# Altium schematic symbol library jlcpcb_2025_04_resistors_extended_2512.schlib: 2667 symbols (part 8 of 14) (continued)
## HPCR2512F0000K9
designator R?  Resistance: 0Ω  (hidden comment: *)
Resistor, 0Ω, ±1%, 2W, 200V, ±100ppm/℃, -55℃~+125℃, SMD 2512; Manufacturer: Uniroyal; Manufacturer Part Number: HPCR2512F0000K9; Supplier 1: LCSC; Supplier Part Number 1: C365489; JLCPCB Part Number: C365489; Power Rating: 2W; Category: Resistors; Package Size: 2512; JLCPCB Basic Part: Yes; Tolerance: ±1%; Voltage Rating: 200V; Temperature Coefficient: ±100ppm/℃; Temperature Rating: -55℃~+125℃; ComponentLink1Description: Datasheet; ComponentLink1URL: https://wmsc.lcsc.com/wmsc/upload/file/pdf/v2/lcsc/2304140030_RESI-HPCR2512F0000K9_C365489.pdf; ComponentLink2Description: JLCPCB Part URL; ComponentLink2URL: https://jlcpcb.com/partdetail/C365489
pins: 1, 2
1 alternate drawing of the same symbol

## HPCR2512F12R0K9
designator R?  Resistance: 12Ω  (hidden comment: *)
Resistor, 12Ω, ±1%, 2W, 200V, ±100ppm/℃, -55℃~+125℃, SMD 2512; Manufacturer: Uniroyal; Manufacturer Part Number: HPCR2512F12R0K9; Supplier 1: LCSC; Supplier Part Number 1: C365371; JLCPCB Part Number: C365371; Power Rating: 2W; Category: Resistors; Package Size: 2512; JLCPCB Basic Part: Yes; Tolerance: ±1%; Voltage Rating: 200V; Temperature Coefficient: ±100ppm/℃; Temperature Rating: -55℃~+125℃; ComponentLink1Description: Datasheet; ComponentLink1URL: https://wmsc.lcsc.com/wmsc/upload/file/pdf/v2/lcsc/2304140030_RESI-HPCR2512F12R0K9_C365371.pdf; ComponentLink2Description: JLCPCB Part URL; ComponentLink2URL: https://jlcpcb.com/partdetail/C365371
pins: 1, 2
1 alternate drawing of the same symbol

## HR2512F1M00E04Z
designator R?  Resistance: 1MΩ  (hidden comment: *)
Resistor, 1MΩ, ±1%, 1W, 800V, -55℃~+155℃, SMD 2512; Manufacturer: Uniroyal; Manufacturer Part Number: HR2512F1M00E04Z; Supplier 1: LCSC; Supplier Part Number 1: C175531; JLCPCB Part Number: C175531; Power Rating: 1W; Category: Resistors; Package Size: 2512; JLCPCB Basic Part: Yes; Tolerance: ±1%; Voltage Rating: 800V; Temperature Rating: -55℃~+155℃; ComponentLink1Description: Datasheet; ComponentLink1URL: https://wmsc.lcsc.com/wmsc/upload/file/pdf/v2/lcsc/2304140030_Ever-Ohms-Tech-HR2512F1M00E04Z_C175531.pdf; ComponentLink2Description: JLCPCB Part URL; ComponentLink2URL: https://jlcpcb.com/partdetail/C175531
pins: 1, 2
1 alternate drawing of the same symbol

## HR2512F47R0E04Z
designator R?  Resistance: 47Ω  (hidden comment: *)
Resistor, 47Ω, ±1%, 1W, 800V, -55℃~+155℃, SMD 2512; Manufacturer: Uniroyal; Manufacturer Part Number: HR2512F47R0E04Z; Supplier 1: LCSC; Supplier Part Number 1: C175524; JLCPCB Part Number: C175524; Power Rating: 1W; Category: Resistors; Package Size: 2512; JLCPCB Basic Part: Yes; Tolerance: ±1%; Voltage Rating: 800V; Temperature Rating: -55℃~+155℃; ComponentLink1Description: Datasheet; ComponentLink1URL: https://wmsc.lcsc.com/wmsc/upload/file/pdf/v2/lcsc/2304140030_Ever-Ohms-Tech-HR2512F47R0E04Z_C175524.pdf; ComponentLink2Description: JLCPCB Part URL; ComponentLink2URL: https://jlcpcb.com/partdetail/C175524
pins: 1, 2
1 alternate drawing of the same symbol

## HR2512F220KE04Z
designator R?  Resistance: 220kΩ  (hidden comment: *)
Resistor, 220kΩ, ±1%, 1W, 800V, -55℃~+155℃, SMD 2512; Manufacturer: Uniroyal; Manufacturer Part Number: HR2512F220KE04Z; Supplier 1: LCSC; Supplier Part Number 1: C175527; JLCPCB Part Number: C175527; Power Rating: 1W; Category: Resistors; Package Size: 2512; JLCPCB Basic Part: Yes; Tolerance: ±1%; Voltage Rating: 800V; Temperature Rating: -55℃~+155℃; ComponentLink1Description: Datasheet; ComponentLink1URL: https://wmsc.lcsc.com/wmsc/upload/file/pdf/v2/lcsc/2304140030_Ever-Ohms-Tech-HR2512F220KE04Z_C175527.pdf; ComponentLink2Description: JLCPCB Part URL; ComponentLink2URL: https://jlcpcb.com/partdetail/C175527
pins: 1, 2
1 alternate drawing of the same symbol

## HR2512F240KE04Z
designator R?  Resistance: 240kΩ  (hidden comment: *)
Resistor, 240kΩ, ±1%, 1W, 800V, -55℃~+155℃, SMD 2512; Manufacturer: Uniroyal; Manufacturer Part Number: HR2512F240KE04Z; Supplier 1: LCSC; Supplier Part Number 1: C175528; JLCPCB Part Number: C175528; Power Rating: 1W; Category: Resistors; Package Size: 2512; JLCPCB Basic Part: Yes; Tolerance: ±1%; Voltage Rating: 800V; Temperature Rating: -55℃~+155℃; ComponentLink1Description: Datasheet; ComponentLink1URL: https://wmsc.lcsc.com/wmsc/upload/file/pdf/v2/lcsc/2304140030_Ever-Ohms-Tech-HR2512F240KE04Z_C175528.pdf; ComponentLink2Description: JLCPCB Part URL; ComponentLink2URL: https://jlcpcb.com/partdetail/C175528
pins: 1, 2
1 alternate drawing of the same symbol

## HR2512F560KE04Z
designator R?  Resistance: 560kΩ  (hidden comment: *)
Resistor, 560kΩ, ±1%, 1W, 800V, -55℃~+155℃, SMD 2512; Manufacturer: Uniroyal; Manufacturer Part Number: HR2512F560KE04Z; Supplier 1: LCSC; Supplier Part Number 1: C175529; JLCPCB Part Number: C175529; Power Rating: 1W; Category: Resistors; Package Size: 2512; JLCPCB Basic Part: Yes; Tolerance: ±1%; Voltage Rating: 800V; Temperature Rating: -55℃~+155℃; ComponentLink1Description: Datasheet; ComponentLink1URL: https://wmsc.lcsc.com/wmsc/upload/file/pdf/v2/lcsc/2304140030_Ever-Ohms-Tech-HR2512F560KE04Z_C175529.pdf; ComponentLink2Description: JLCPCB Part URL; ComponentLink2URL: https://jlcpcb.com/partdetail/C175529
pins: 1, 2
1 alternate drawing of the same symbol

## HR2512J62KE04
designator R?  Resistance: 62kΩ  (hidden comment: *)
Resistor, 62kΩ, ±5%, 1W, 800V, -55℃~+155℃, SMD 2512; Manufacturer: Uniroyal; Manufacturer Part Number: HR2512J62KE04; Supplier 1: LCSC; Supplier Part Number 1: C175532; JLCPCB Part Number: C175532; Power Rating: 1W; Category: Resistors; Package Size: 2512; JLCPCB Basic Part: Yes; Tolerance: ±5%; Voltage Rating: 800V; Temperature Rating: -55℃~+155℃; ComponentLink1Description: Datasheet; ComponentLink1URL: https://wmsc.lcsc.com/wmsc/upload/file/pdf/v2/lcsc/2304140030_Ever-Ohms-Tech-HR2512J62KE04_C175532.pdf; ComponentLink2Description: JLCPCB Part URL; ComponentLink2URL: https://jlcpcb.com/partdetail/C175532
pins: 1, 2
1 alternate drawing of the same symbol

## LMJ25NF2P0R002
designator R?  Resistance: 2mΩ  (hidden comment: *)
Resistor, 2mΩ, ±1%, 2W, ±50ppm/℃, SMD 2512; Manufacturer: Uniroyal; Manufacturer Part Number: LMJ25NF2P0R002; Supplier 1: LCSC; Supplier Part Number 1: C2838943; JLCPCB Part Number: C2838943; Power Rating: 2W; Category: Resistors; Package Size: 2512; JLCPCB Basic Part: Yes; Tolerance: ±1%; Temperature Coefficient: ±50ppm/℃; ComponentLink1Description: Datasheet; ComponentLink1URL: https://wmsc.lcsc.com/wmsc/upload/file/pdf/v2/lcsc/2203210916_prosemi-LMJ25NF2P0R002_C2838943.pdf; ComponentLink2Description: JLCPCB Part URL; ComponentLink2URL: https://jlcpcb.com/partdetail/C2838943
pins: 1, 2
1 alternate drawing of the same symbol

## LMP25KF2P0R220
designator R?  Resistance: 220mΩ  (hidden comment: *)
Resistor, 220mΩ, ±1%, 2W, ±50ppm/℃, SMD 2512; Manufacturer: Uniroyal; Manufacturer Part Number: LMP25KF2P0R220; Supplier 1: LCSC; Supplier Part Number 1: C2937397; JLCPCB Part Number: C2937397; Power Rating: 2W; Category: Resistors; Package Size: 2512; JLCPCB Basic Part: Yes; Tolerance: ±1%; Temperature Coefficient: ±50ppm/℃; ComponentLink1Description: Datasheet; ComponentLink1URL: https://wmsc.lcsc.com/wmsc/upload/file/pdf/v2/lcsc/2201131730_prosemi-LMP25KF2P0R220_C2937397.pdf; ComponentLink2Description: JLCPCB Part URL; ComponentLink2URL: https://jlcpcb.com/partdetail/C2937397
pins: 1, 2
1 alternate drawing of the same symbol

## LMP25KF2P0R500
designator R?  Resistance: 500mΩ  (hidden comment: *)
Resistor, 500mΩ, ±1%, 2W, ±50ppm/℃, SMD 2512; Manufacturer: Uniroyal; Manufacturer Part Number: LMP25KF2P0R500; Supplier 1: LCSC; Supplier Part Number 1: C2937398; JLCPCB Part Number: C2937398; Power Rating: 2W; Category: Resistors; Package Size: 2512; JLCPCB Basic Part: Yes; Tolerance: ±1%; Temperature Coefficient: ±50ppm/℃; ComponentLink1Description: Datasheet; ComponentLink1URL: https://wmsc.lcsc.com/wmsc/upload/file/pdf/v2/lcsc/2201131730_prosemi-LMP25KF2P0R500_C2937398.pdf; ComponentLink2Description: JLCPCB Part URL; ComponentLink2URL: https://jlcpcb.com/partdetail/C2937398
pins: 1, 2
1 alternate drawing of the same symbol

## LMP25MF2P0R003S
designator R?  Resistance: 3mΩ  (hidden comment: *)
Resistor, 3mΩ, ±1%, 2W, ±50ppm/℃, -55℃~+170℃, SMD 2512; Manufacturer: Uniroyal; Manufacturer Part Number: LMP25MF2P0R003S; Supplier 1: LCSC; Supplier Part Number 1: C2937400; JLCPCB Part Number: C2937400; Power Rating: 2W; Category: Resistors; Package Size: 2512; JLCPCB Basic Part: Yes; Tolerance: ±1%; Temperature Coefficient: ±50ppm/℃; Temperature Rating: -55℃~+170℃; ComponentLink1Description: Datasheet; ComponentLink1URL: https://wmsc.lcsc.com/wmsc/upload/file/pdf/v2/lcsc/2201131730_prosemi-LMP25MF2P0R003S_C2937400.pdf; ComponentLink2Description: JLCPCB Part URL; ComponentLink2URL: https://jlcpcb.com/partdetail/C2937400
pins: 1, 2
1 alternate drawing of the same symbol

## LMP25MF2P0R004S
designator R?  Resistance: 4mΩ  (hidden comment: *)
Resistor, 4mΩ, ±1%, 2W, ±50ppm/℃, SMD 2512; Manufacturer: Uniroyal; Manufacturer Part Number: LMP25MF2P0R004S; Supplier 1: LCSC; Supplier Part Number 1: C2937401; JLCPCB Part Number: C2937401; Power Rating: 2W; Category: Resistors; Package Size: 2512; JLCPCB Basic Part: Yes; Tolerance: ±1%; Temperature Coefficient: ±50ppm/℃; ComponentLink1Description: Datasheet; ComponentLink1URL: https://wmsc.lcsc.com/wmsc/upload/file/pdf/v2/lcsc/2201131730_prosemi-LMP25MF2P0R004S_C2937401.pdf; ComponentLink2Description: JLCPCB Part URL; ComponentLink2URL: https://jlcpcb.com/partdetail/C2937401
pins: 1, 2
1 alternate drawing of the same symbol

## LMP25MF2P0R005
designator R?  Resistance: 5mΩ  (hidden comment: *)
Resistor, 5mΩ, ±1%, 2W, ±50ppm/℃, SMD 2512; Manufacturer: Uniroyal; Manufacturer Part Number: LMP25MF2P0R005; Supplier 1: LCSC; Supplier Part Number 1: C2937402; JLCPCB Part Number: C2937402; Power Rating: 2W; Category: Resistors; Package Size: 2512; JLCPCB Basic Part: Yes; Tolerance: ±1%; Temperature Coefficient: ±50ppm/℃; ComponentLink1Description: Datasheet; ComponentLink1URL: https://wmsc.lcsc.com/wmsc/upload/file/pdf/v2/lcsc/2201131730_prosemi-LMP25MF2P0R005_C2937402.pdf; ComponentLink2Description: JLCPCB Part URL; ComponentLink2URL: https://jlcpcb.com/partdetail/C2937402
pins: 1, 2
1 alternate drawing of the same symbol

## LMP25MF2P0R010
designator R?  Resistance: 10mΩ  (hidden comment: *)
Resistor, 10mΩ, ±1%, 2W, ±50ppm/℃, SMD 2512; Manufacturer: Uniroyal; Manufacturer Part Number: LMP25MF2P0R010; Supplier 1: LCSC; Supplier Part Number 1: C2937403; JLCPCB Part Number: C2937403; Power Rating: 2W; Category: Resistors; Package Size: 2512; JLCPCB Basic Part: Yes; Tolerance: ±1%; Temperature Coefficient: ±50ppm/℃; ComponentLink1Description: Datasheet; ComponentLink1URL: https://wmsc.lcsc.com/wmsc/upload/file/pdf/v2/lcsc/2201131730_prosemi-LMP25MF2P0R010_C2937403.pdf; ComponentLink2Description: JLCPCB Part URL; ComponentLink2URL: https://jlcpcb.com/partdetail/C2937403
pins: 1, 2
1 alternate drawing of the same symbol

## LMP25MF3P0R001S
designator R?  Resistance: 1mΩ  (hidden comment: *)
Resistor, 1mΩ, ±1%, 3W, ±50ppm/℃, -55℃~+170℃, SMD 2512; Manufacturer: Uniroyal; Manufacturer Part Number: LMP25MF3P0R001S; Supplier 1: LCSC; Supplier Part Number 1: C2937404; JLCPCB Part Number: C2937404; Power Rating: 3W; Category: Resistors; Package Size: 2512; JLCPCB Basic Part: Yes; Tolerance: ±1%; Temperature Coefficient: ±50ppm/℃; Temperature Rating: -55℃~+170℃; ComponentLink1Description: Datasheet; ComponentLink1URL: https://wmsc.lcsc.com/wmsc/upload/file/pdf/v2/lcsc/2201131730_prosemi-LMP25MF3P0R001S_C2937404.pdf; ComponentLink2Description: JLCPCB Part URL; ComponentLink2URL: https://jlcpcb.com/partdetail/C2937404
pins: 1, 2
1 alternate drawing of the same symbol

## LMP25MF3P0R003S
designator R?  Resistance: 3mΩ  (hidden comment: *)
Resistor, 3mΩ, ±1%, 3W, ±50ppm/℃, SMD 2512; Manufacturer: Uniroyal; Manufacturer Part Number: LMP25MF3P0R003S; Supplier 1: LCSC; Supplier Part Number 1: C2937405; JLCPCB Part Number: C2937405; Power Rating: 3W; Category: Resistors; Package Size: 2512; JLCPCB Basic Part: Yes; Tolerance: ±1%; Temperature Coefficient: ±50ppm/℃; ComponentLink1Description: Datasheet; ComponentLink1URL: https://wmsc.lcsc.com/wmsc/upload/file/pdf/v2/lcsc/2201131730_prosemi-LMP25MF3P0R003S_C2937405.pdf; ComponentLink2Description: JLCPCB Part URL; ComponentLink2URL: https://jlcpcb.com/partdetail/C2937405
pins: 1, 2
1 alternate drawing of the same symbol

## LMP25NF2P0R012
designator R?  Resistance: 12mΩ  (hidden comment: *)
Resistor, 12mΩ, ±1%, 2W, ±50ppm/℃, SMD 2512; Manufacturer: Uniroyal; Manufacturer Part Number: LMP25NF2P0R012; Supplier 1: LCSC; Supplier Part Number 1: C2937408; JLCPCB Part Number: C2937408; Power Rating: 2W; Category: Resistors; Package Size: 2512; JLCPCB Basic Part: Yes; Tolerance: ±1%; Temperature Coefficient: ±50ppm/℃; ComponentLink1Description: Datasheet; ComponentLink1URL: https://wmsc.lcsc.com/wmsc/upload/file/pdf/v2/lcsc/2201131730_prosemi-LMP25NF2P0R012_C2937408.pdf; ComponentLink2Description: JLCPCB Part URL; ComponentLink2URL: https://jlcpcb.com/partdetail/C2937408
pins: 1, 2
1 alternate drawing of the same symbol

## LMP25NF2P0R075
designator R?  Resistance: 75mΩ  (hidden comment: *)
Resistor, 75mΩ, ±1%, 2W, ±50ppm/℃, SMD 2512; Manufacturer: Uniroyal; Manufacturer Part Number: LMP25NF2P0R075; Supplier 1: LCSC; Supplier Part Number 1: C2937410; JLCPCB Part Number: C2937410; Power Rating: 2W; Category: Resistors; Package Size: 2512; JLCPCB Basic Part: Yes; Tolerance: ±1%; Temperature Coefficient: ±50ppm/℃; ComponentLink1Description: Datasheet; ComponentLink1URL: https://wmsc.lcsc.com/wmsc/upload/file/pdf/v2/lcsc/2201131730_prosemi-LMP25NF2P0R075_C2937410.pdf; ComponentLink2Description: JLCPCB Part URL; ComponentLink2URL: https://jlcpcb.com/partdetail/C2937410
pins: 1, 2
1 alternate drawing of the same symbol

## LMP25NF3P0R035
designator R?  Resistance: 35mΩ  (hidden comment: *)
Resistor, 35mΩ, ±1%, 3W, ±50ppm/℃, SMD 2512; Manufacturer: Uniroyal; Manufacturer Part Number: LMP25NF3P0R035; Supplier 1: LCSC; Supplier Part Number 1: C2937411; JLCPCB Part Number: C2937411; Power Rating: 3W; Category: Resistors; Package Size: 2512; JLCPCB Basic Part: Yes; Tolerance: ±1%; Temperature Coefficient: ±50ppm/℃; ComponentLink1Description: Datasheet; ComponentLink1URL: https://wmsc.lcsc.com/wmsc/upload/file/pdf/v2/lcsc/2203221230_prosemi-LMP25NF3P0R035_C2937411.pdf; ComponentLink2Description: JLCPCB Part URL; ComponentLink2URL: https://jlcpcb.com/partdetail/C2937411
pins: 1, 2
1 alternate drawing of the same symbol

## LMP25NF3P0R060
designator R?  Resistance: 60mΩ  (hidden comment: *)
Resistor, 60mΩ, ±1%, 3W, ±50ppm/℃, SMD 2512; Manufacturer: Uniroyal; Manufacturer Part Number: LMP25NF3P0R060; Supplier 1: LCSC; Supplier Part Number 1: C2937412; JLCPCB Part Number: C2937412; Power Rating: 3W; Category: Resistors; Package Size: 2512; JLCPCB Basic Part: Yes; Tolerance: ±1%; Temperature Coefficient: ±50ppm/℃; ComponentLink1Description: Datasheet; ComponentLink1URL: https://wmsc.lcsc.com/wmsc/upload/file/pdf/v2/lcsc/2203221230_prosemi-LMP25NF3P0R060_C2937412.pdf; ComponentLink2Description: JLCPCB Part URL; ComponentLink2URL: https://jlcpcb.com/partdetail/C2937412
pins: 1, 2
1 alternate drawing of the same symbol

## LR12FTDSR001
designator R?  Resistance: 1mΩ  (hidden comment: *)
Resistor, 1mΩ, ±1%, 2W, ±50ppm/℃, -55℃~+170℃, SMD 2512; Manufacturer: Uniroyal; Manufacturer Part Number: LR12FTDSR001; Supplier 1: LCSC; Supplier Part Number 1: C2913006; JLCPCB Part Number: C2913006; Power Rating: 2W; Category: Resistors; Package Size: 2512; JLCPCB Basic Part: Yes; Tolerance: ±1%; Temperature Coefficient: ±50ppm/℃; Temperature Rating: -55℃~+170℃; ComponentLink1Description: Datasheet; ComponentLink1URL: https://wmsc.lcsc.com/wmsc/upload/file/pdf/v2/lcsc/2110281830_Viking-Tech-LR12FTDSR001_C2913006.pdf; ComponentLink2Description: JLCPCB Part URL; ComponentLink2URL: https://jlcpcb.com/partdetail/C2913006
pins: 1, 2
1 alternate drawing of the same symbol

## LR122WF220LT4E
designator R?  Resistance: 220mΩ  (hidden comment: *)
Resistor, 220mΩ, ±1%, 2W, SMD 2512; Manufacturer: Uniroyal; Manufacturer Part Number: LR122WF220LT4E; Supplier 1: LCSC; Supplier Part Number 1: C2941078; JLCPCB Part Number: C2941078; Power Rating: 2W; Category: Resistors; Package Size: 2512; JLCPCB Basic Part: Yes; Tolerance: ±1%; ComponentLink1Description: Datasheet; ComponentLink1URL: https://wmsc.lcsc.com/wmsc/upload/file/pdf/v2/lcsc/2308091127_UNI-ROYAL-Uniroyal-Elec-LR122WF220LT4E_C2941078.pdf; ComponentLink2Description: JLCPCB Part URL; ComponentLink2URL: https://jlcpcb.com/partdetail/C2941078
pins: 1, 2
1 alternate drawing of the same symbol

## LR122WF500MT4E
designator R?  Resistance: 50mΩ  (hidden comment: *)
Resistor, 50mΩ, ±1%, 2W, ±50ppm/℃, SMD 2512; Manufacturer: Uniroyal; Manufacturer Part Number: LR122WF500MT4E; Supplier 1: LCSC; Supplier Part Number 1: C2941069; JLCPCB Part Number: C2941069; Power Rating: 2W; Category: Resistors; Package Size: 2512; JLCPCB Basic Part: Yes; Tolerance: ±1%; Temperature Coefficient: ±50ppm/℃; ComponentLink1Description: Datasheet; ComponentLink1URL: https://wmsc.lcsc.com/wmsc/upload/file/pdf/v2/lcsc/2207141800_UNI-ROYAL-Uniroyal-Elec-LR122WF500MT4E_C2941069.pdf; ComponentLink2Description: JLCPCB Part URL; ComponentLink2URL: https://jlcpcb.com/partdetail/C2941069
pins: 1, 2
1 alternate drawing of the same symbol

## LR123WF100NT4E
designator R?  Resistance: 1mΩ  (hidden comment: *)
Resistor, 1mΩ, ±1%, 3W, ±50ppm/℃, SMD 2512; Manufacturer: Uniroyal; Manufacturer Part Number: LR123WF100NT4E; Supplier 1: LCSC; Supplier Part Number 1: C2941088; JLCPCB Part Number: C2941088; Power Rating: 3W; Category: Resistors; Package Size: 2512; JLCPCB Basic Part: Yes; Tolerance: ±1%; Temperature Coefficient: ±50ppm/℃; ComponentLink1Description: Datasheet; ComponentLink1URL: https://wmsc.lcsc.com/wmsc/upload/file/pdf/v2/lcsc/2204181745_UNI-ROYAL-Uniroyal-Elec-LR123WF100NT4E_C2941088.pdf; ComponentLink2Description: JLCPCB Part URL; ComponentLink2URL: https://jlcpcb.com/partdetail/C2941088
pins: 1, 2
1 alternate drawing of the same symbol

## LR123WF300NT4E
designator R?  Resistance: 3mΩ  (hidden comment: *)
Resistor, 3mΩ, ±1%, 3W, ±50ppm/℃, SMD 2512; Manufacturer: Uniroyal; Manufacturer Part Number: LR123WF300NT4E; Supplier 1: LCSC; Supplier Part Number 1: C2941089; JLCPCB Part Number: C2941089; Power Rating: 3W; Category: Resistors; Package Size: 2512; JLCPCB Basic Part: Yes; Tolerance: ±1%; Temperature Coefficient: ±50ppm/℃; ComponentLink1Description: Datasheet; ComponentLink1URL: https://wmsc.lcsc.com/wmsc/upload/file/pdf/v2/lcsc/2204181745_UNI-ROYAL-Uniroyal-Elec-LR123WF300NT4E_C2941089.pdf; ComponentLink2Description: JLCPCB Part URL; ComponentLink2URL: https://jlcpcb.com/partdetail/C2941089
pins: 1, 2
1 alternate drawing of the same symbol

## MCPWR12FTEA0330
designator R?  Resistance: 33Ω  (hidden comment: *)
Resistor, 33Ω, ±1%, 1.5W, SMD 2512; Manufacturer: Uniroyal; Manufacturer Part Number: MCPWR12FTEA0330; Supplier 1: LCSC; Supplier Part Number 1: C243034; JLCPCB Part Number: C243034; Power Rating: 1.5W; Category: Resistors; Package Size: 2512; JLCPCB Basic Part: Yes; Tolerance: ±1%; ComponentLink1Description: Datasheet; ComponentLink1URL: https://wmsc.lcsc.com/wmsc/upload/file/pdf/v2/lcsc/2304140030_Multicomp-MCPWR12FTEA0330_C243034.pdf; ComponentLink2Description: JLCPCB Part URL; ComponentLink2URL: https://jlcpcb.com/partdetail/C243034
pins: 1, 2
1 alternate drawing of the same symbol

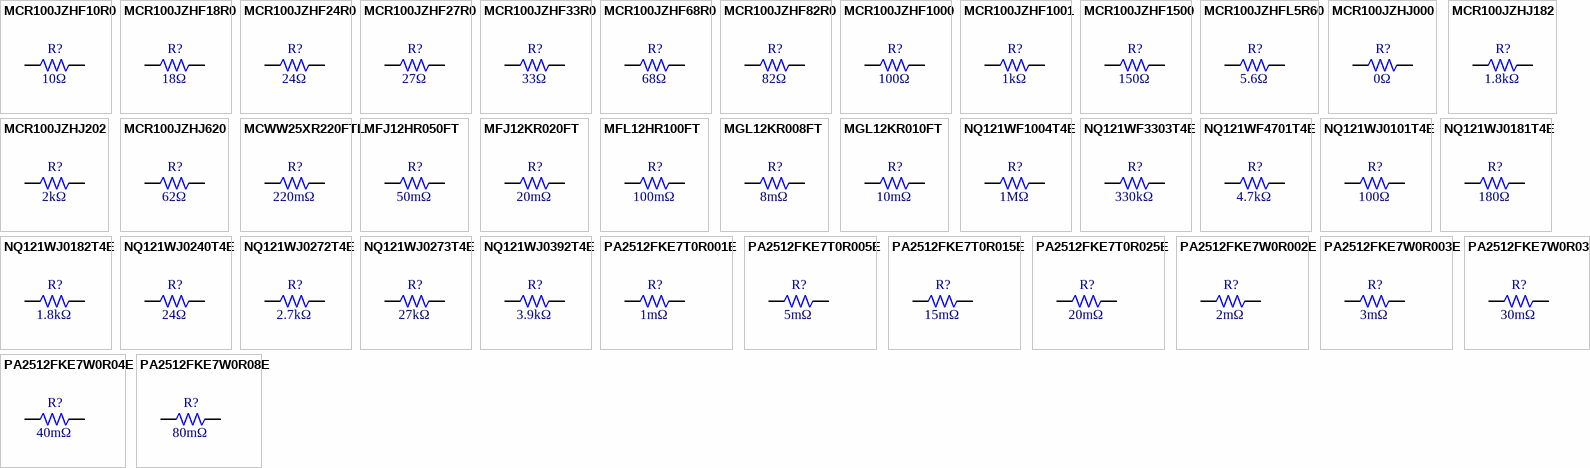
[diagram p39: symbols MCR100JZHF10R0 to PA2512FKE7W0R08E]

## MCR100JZHF10R0
designator R?  Resistance: 10Ω  (hidden comment: *)
Resistor, 10Ω, ±1%, 1W, ±100ppm/℃, SMD 2512; Manufacturer: Uniroyal; Manufacturer Part Number: MCR100JZHF10R0; Supplier 1: LCSC; Supplier Part Number 1: C162016; JLCPCB Part Number: C162016; Power Rating: 1W; Category: Resistors; Package Size: 2512; JLCPCB Basic Part: Yes; Tolerance: ±1%; Temperature Coefficient: ±100ppm/℃; ComponentLink1Description: Datasheet; ComponentLink1URL: https://wmsc.lcsc.com/wmsc/upload/file/pdf/v2/lcsc/2007130932_ROHM-Semicon-MCR100JZHF10R0_C162016.pdf; ComponentLink2Description: JLCPCB Part URL; ComponentLink2URL: https://jlcpcb.com/partdetail/C162016
pins: 1, 2
1 alternate drawing of the same symbol

## MCR100JZHF18R0
designator R?  Resistance: 18Ω  (hidden comment: *)
Resistor, 18Ω, ±1%, 1W, 150V, ±100ppm/℃, -55℃~+155℃, SMD 2512; Manufacturer: Uniroyal; Manufacturer Part Number: MCR100JZHF18R0; Supplier 1: LCSC; Supplier Part Number 1: C308341; JLCPCB Part Number: C308341; Power Rating: 1W; Category: Resistors; Package Size: 2512; JLCPCB Basic Part: Yes; Tolerance: ±1%; Voltage Rating: 150V; Temperature Coefficient: ±100ppm/℃; Temperature Rating: -55℃~+155℃; ComponentLink1Description: Datasheet; ComponentLink1URL: https://wmsc.lcsc.com/wmsc/upload/file/pdf/v2/lcsc/2304140030_ROHM-Semicon-MCR100JZHF18R0_C308341.pdf; ComponentLink2Description: JLCPCB Part URL; ComponentLink2URL: https://jlcpcb.com/partdetail/C308341
pins: 1, 2
1 alternate drawing of the same symbol

## MCR100JZHF24R0
designator R?  Resistance: 24Ω  (hidden comment: *)
Resistor, 24Ω, ±1%, 1W, 150V, ±100ppm/℃, -55℃~+155℃, SMD 2512; Manufacturer: Uniroyal; Manufacturer Part Number: MCR100JZHF24R0; Supplier 1: LCSC; Supplier Part Number 1: C308344; JLCPCB Part Number: C308344; Power Rating: 1W; Category: Resistors; Package Size: 2512; JLCPCB Basic Part: Yes; Tolerance: ±1%; Voltage Rating: 150V; Temperature Coefficient: ±100ppm/℃; Temperature Rating: -55℃~+155℃; ComponentLink1Description: Datasheet; ComponentLink1URL: https://wmsc.lcsc.com/wmsc/upload/file/pdf/v2/lcsc/2304140030_ROHM-Semicon-MCR100JZHF24R0_C308344.pdf; ComponentLink2Description: JLCPCB Part URL; ComponentLink2URL: https://jlcpcb.com/partdetail/C308344
pins: 1, 2
1 alternate drawing of the same symbol

## MCR100JZHF27R0
designator R?  Resistance: 27Ω  (hidden comment: *)
Resistor, 27Ω, ±1%, 1W, 150V, ±100ppm/℃, -55℃~+155℃, SMD 2512; Manufacturer: Uniroyal; Manufacturer Part Number: MCR100JZHF27R0; Supplier 1: LCSC; Supplier Part Number 1: C507439; JLCPCB Part Number: C507439; Power Rating: 1W; Category: Resistors; Package Size: 2512; JLCPCB Basic Part: Yes; Tolerance: ±1%; Voltage Rating: 150V; Temperature Coefficient: ±100ppm/℃; Temperature Rating: -55℃~+155℃; ComponentLink1Description: Datasheet; ComponentLink1URL: https://wmsc.lcsc.com/wmsc/upload/file/pdf/v2/lcsc/2005301907_ROHM-Semicon-MCR100JZHF27R0_C507439.pdf; ComponentLink2Description: JLCPCB Part URL; ComponentLink2URL: https://jlcpcb.com/partdetail/C507439
pins: 1, 2
1 alternate drawing of the same symbol

## MCR100JZHF33R0
designator R?  Resistance: 33Ω  (hidden comment: *)
Resistor, 33Ω, ±1%, 1W, 150V, ±100ppm/℃, -55℃~+155℃, SMD 2512; Manufacturer: Uniroyal; Manufacturer Part Number: MCR100JZHF33R0; Supplier 1: LCSC; Supplier Part Number 1: C308345; JLCPCB Part Number: C308345; Power Rating: 1W; Category: Resistors; Package Size: 2512; JLCPCB Basic Part: Yes; Tolerance: ±1%; Voltage Rating: 150V; Temperature Coefficient: ±100ppm/℃; Temperature Rating: -55℃~+155℃; ComponentLink1Description: Datasheet; ComponentLink1URL: https://wmsc.lcsc.com/wmsc/upload/file/pdf/v2/lcsc/2304140030_ROHM-Semicon-MCR100JZHF33R0_C308345.pdf; ComponentLink2Description: JLCPCB Part URL; ComponentLink2URL: https://jlcpcb.com/partdetail/C308345
pins: 1, 2
1 alternate drawing of the same symbol

## MCR100JZHF68R0
designator R?  Resistance: 68Ω  (hidden comment: *)
Resistor, 68Ω, ±1%, 1W, 150V, ±100ppm/℃, -55℃~+155℃, SMD 2512; Manufacturer: Uniroyal; Manufacturer Part Number: MCR100JZHF68R0; Supplier 1: LCSC; Supplier Part Number 1: C308347; JLCPCB Part Number: C308347; Power Rating: 1W; Category: Resistors; Package Size: 2512; JLCPCB Basic Part: Yes; Tolerance: ±1%; Voltage Rating: 150V; Temperature Coefficient: ±100ppm/℃; Temperature Rating: -55℃~+155℃; ComponentLink1Description: Datasheet; ComponentLink1URL: https://wmsc.lcsc.com/wmsc/upload/file/pdf/v2/lcsc/2304140030_ROHM-Semicon-MCR100JZHF68R0_C308347.pdf; ComponentLink2Description: JLCPCB Part URL; ComponentLink2URL: https://jlcpcb.com/partdetail/C308347
pins: 1, 2
1 alternate drawing of the same symbol

## MCR100JZHF82R0
designator R?  Resistance: 82Ω  (hidden comment: *)
Resistor, 82Ω, ±1%, 1W, 150V, ±100ppm/℃, -55℃~+155℃, SMD 2512; Manufacturer: Uniroyal; Manufacturer Part Number: MCR100JZHF82R0; Supplier 1: LCSC; Supplier Part Number 1: C308349; JLCPCB Part Number: C308349; Power Rating: 1W; Category: Resistors; Package Size: 2512; JLCPCB Basic Part: Yes; Tolerance: ±1%; Voltage Rating: 150V; Temperature Coefficient: ±100ppm/℃; Temperature Rating: -55℃~+155℃; ComponentLink1Description: Datasheet; ComponentLink1URL: https://wmsc.lcsc.com/wmsc/upload/file/pdf/v2/lcsc/2304140030_ROHM-Semicon-MCR100JZHF82R0_C308349.pdf; ComponentLink2Description: JLCPCB Part URL; ComponentLink2URL: https://jlcpcb.com/partdetail/C308349
pins: 1, 2
1 alternate drawing of the same symbol

## MCR100JZHF1000
designator R?  Resistance: 100Ω  (hidden comment: *)
Resistor, 100Ω, ±1%, 1W, 150V, ±100ppm/℃, -55℃~+155℃, SMD 2512; Manufacturer: Uniroyal; Manufacturer Part Number: MCR100JZHF1000; Supplier 1: LCSC; Supplier Part Number 1: C507452; JLCPCB Part Number: C507452; Power Rating: 1W; Category: Resistors; Package Size: 2512; JLCPCB Basic Part: Yes; Tolerance: ±1%; Voltage Rating: 150V; Temperature Coefficient: ±100ppm/℃; Temperature Rating: -55℃~+155℃; ComponentLink1Description: Datasheet; ComponentLink1URL: https://wmsc.lcsc.com/wmsc/upload/file/pdf/v2/lcsc/2005142146_ROHM-Semicon-MCR100JZHF1000_C507452.pdf; ComponentLink2Description: JLCPCB Part URL; ComponentLink2URL: https://jlcpcb.com/partdetail/C507452
pins: 1, 2
1 alternate drawing of the same symbol

## MCR100JZHF1001
designator R?  Resistance: 1kΩ  (hidden comment: *)
Resistor, 1kΩ, ±1%, 1W, 150V, ±100ppm/℃, -55℃~+155℃, SMD 2512; Manufacturer: Uniroyal; Manufacturer Part Number: MCR100JZHF1001; Supplier 1: LCSC; Supplier Part Number 1: C308340; JLCPCB Part Number: C308340; Power Rating: 1W; Category: Resistors; Package Size: 2512; JLCPCB Basic Part: Yes; Tolerance: ±1%; Voltage Rating: 150V; Temperature Coefficient: ±100ppm/℃; Temperature Rating: -55℃~+155℃; ComponentLink1Description: Datasheet; ComponentLink1URL: https://wmsc.lcsc.com/wmsc/upload/file/pdf/v2/lcsc/2304140030_ROHM-Semicon-MCR100JZHF1001_C308340.pdf; ComponentLink2Description: JLCPCB Part URL; ComponentLink2URL: https://jlcpcb.com/partdetail/C308340
pins: 1, 2
1 alternate drawing of the same symbol

## MCR100JZHF1500
designator R?  Resistance: 150Ω  (hidden comment: *)
Resistor, 150Ω, ±1%, 1W, 150V, ±100ppm/℃, -55℃~+155℃, SMD 2512; Manufacturer: Uniroyal; Manufacturer Part Number: MCR100JZHF1500; Supplier 1: LCSC; Supplier Part Number 1: C507441; JLCPCB Part Number: C507441; Power Rating: 1W; Category: Resistors; Package Size: 2512; JLCPCB Basic Part: Yes; Tolerance: ±1%; Voltage Rating: 150V; Temperature Coefficient: ±100ppm/℃; Temperature Rating: -55℃~+155℃; ComponentLink1Description: Datasheet; ComponentLink1URL: https://wmsc.lcsc.com/wmsc/upload/file/pdf/v2/lcsc/2004021108_ROHM-Semicon-MCR100JZHF1500_C507441.pdf; ComponentLink2Description: JLCPCB Part URL; ComponentLink2URL: https://jlcpcb.com/partdetail/C507441
pins: 1, 2
1 alternate drawing of the same symbol

## MCR100JZHFL5R60
designator R?  Resistance: 5.6Ω  (hidden comment: *)
Resistor, 5.6Ω, ±1%, 1W, 150V, ±100ppm/℃, -55℃~+155℃, SMD 2512; Manufacturer: Uniroyal; Manufacturer Part Number: MCR100JZHFL5R60; Supplier 1: LCSC; Supplier Part Number 1: C308350; JLCPCB Part Number: C308350; Power Rating: 1W; Category: Resistors; Package Size: 2512; JLCPCB Basic Part: Yes; Tolerance: ±1%; Voltage Rating: 150V; Temperature Coefficient: ±100ppm/℃; Temperature Rating: -55℃~+155℃; ComponentLink1Description: Datasheet; ComponentLink1URL: https://wmsc.lcsc.com/wmsc/upload/file/pdf/v2/lcsc/2304140030_ROHM-Semicon-MCR100JZHFL5R60_C308350.pdf; ComponentLink2Description: JLCPCB Part URL; ComponentLink2URL: https://jlcpcb.com/partdetail/C308350
pins: 1, 2
1 alternate drawing of the same symbol

## MCR100JZHJ000
designator R?  Resistance: 0Ω  (hidden comment: *)
Resistor, 0Ω, ±5%, 1W, 150V, -55℃~+155℃, SMD 2512; Manufacturer: Uniroyal; Manufacturer Part Number: MCR100JZHJ000; Supplier 1: LCSC; Supplier Part Number 1: C308352; JLCPCB Part Number: C308352; Power Rating: 1W; Category: Resistors; Package Size: 2512; JLCPCB Basic Part: Yes; Tolerance: ±5%; Voltage Rating: 150V; Temperature Rating: -55℃~+155℃; ComponentLink1Description: Datasheet; ComponentLink1URL: https://wmsc.lcsc.com/wmsc/upload/file/pdf/v2/lcsc/2304140030_ROHM-Semicon-MCR100JZHJ000_C308352.pdf; ComponentLink2Description: JLCPCB Part URL; ComponentLink2URL: https://jlcpcb.com/partdetail/C308352
pins: 1, 2
1 alternate drawing of the same symbol

## MCR100JZHJ182
designator R?  Resistance: 1.8kΩ  (hidden comment: *)
Resistor, 1.8kΩ, ±5%, 1W, 150V, ±200ppm/℃, -55℃~+125℃, SMD 2512; Manufacturer: Uniroyal; Manufacturer Part Number: MCR100JZHJ182; Supplier 1: LCSC; Supplier Part Number 1: C308353; JLCPCB Part Number: C308353; Power Rating: 1W; Category: Resistors; Package Size: 2512; JLCPCB Basic Part: Yes; Tolerance: ±5%; Voltage Rating: 150V; Temperature Coefficient: ±200ppm/℃; Temperature Rating: -55℃~+125℃; ComponentLink1Description: Datasheet; ComponentLink1URL: https://wmsc.lcsc.com/wmsc/upload/file/pdf/v2/lcsc/2304140030_ROHM-Semicon-MCR100JZHJ182_C308353.pdf; ComponentLink2Description: JLCPCB Part URL; ComponentLink2URL: https://jlcpcb.com/partdetail/C308353
pins: 1, 2
1 alternate drawing of the same symbol

## MCR100JZHJ202
designator R?  Resistance: 2kΩ  (hidden comment: *)
Resistor, 2kΩ, ±5%, 1W, 150V, ±200ppm/℃, -55℃~+155℃, SMD 2512; Manufacturer: Uniroyal; Manufacturer Part Number: MCR100JZHJ202; Supplier 1: LCSC; Supplier Part Number 1: C308355; JLCPCB Part Number: C308355; Power Rating: 1W; Category: Resistors; Package Size: 2512; JLCPCB Basic Part: Yes; Tolerance: ±5%; Voltage Rating: 150V; Temperature Coefficient: ±200ppm/℃; Temperature Rating: -55℃~+155℃; ComponentLink1Description: Datasheet; ComponentLink1URL: https://wmsc.lcsc.com/wmsc/upload/file/pdf/v2/lcsc/2304140030_ROHM-Semicon-MCR100JZHJ202_C308355.pdf; ComponentLink2Description: JLCPCB Part URL; ComponentLink2URL: https://jlcpcb.com/partdetail/C308355
pins: 1, 2
1 alternate drawing of the same symbol

## MCR100JZHJ620
designator R?  Resistance: 62Ω  (hidden comment: *)
Resistor, 62Ω, ±5%, 1W, 150V, ±200ppm/℃, -55℃~+155℃, SMD 2512; Manufacturer: Uniroyal; Manufacturer Part Number: MCR100JZHJ620; Supplier 1: LCSC; Supplier Part Number 1: C308357; JLCPCB Part Number: C308357; Power Rating: 1W; Category: Resistors; Package Size: 2512; JLCPCB Basic Part: Yes; Tolerance: ±5%; Voltage Rating: 150V; Temperature Coefficient: ±200ppm/℃; Temperature Rating: -55℃~+155℃; ComponentLink1Description: Datasheet; ComponentLink1URL: https://wmsc.lcsc.com/wmsc/upload/file/pdf/v2/lcsc/2304140030_ROHM-Semicon-MCR100JZHJ620_C308357.pdf; ComponentLink2Description: JLCPCB Part URL; ComponentLink2URL: https://jlcpcb.com/partdetail/C308357
pins: 1, 2
1 alternate drawing of the same symbol

## MCWW25XR220FTL
designator R?  Resistance: 220mΩ  (hidden comment: *)
Resistor, 220mΩ, ±1%, 1W, SMD 2512; Manufacturer: Uniroyal; Manufacturer Part Number: MCWW25XR220FTL; Supplier 1: LCSC; Supplier Part Number 1: C243131; JLCPCB Part Number: C243131; Power Rating: 1W; Category: Resistors; Package Size: 2512; JLCPCB Basic Part: Yes; Tolerance: ±1%; ComponentLink1Description: Datasheet; ComponentLink1URL: https://wmsc.lcsc.com/wmsc/upload/file/pdf/v2/lcsc/2304140030_Multicomp-MCWW25XR220FTL_C243131.pdf; ComponentLink2Description: JLCPCB Part URL; ComponentLink2URL: https://jlcpcb.com/partdetail/C243131
pins: 1, 2
1 alternate drawing of the same symbol

## MFJ12HR050FT
designator R?  Resistance: 50mΩ  (hidden comment: *)
Resistor, 50mΩ, ±1%, 1W, ±50ppm/℃, SMD 2512; Manufacturer: Uniroyal; Manufacturer Part Number: MFJ12HR050FT; Supplier 1: LCSC; Supplier Part Number 1: C2936658; JLCPCB Part Number: C2936658; Power Rating: 1W; Category: Resistors; Package Size: 2512; JLCPCB Basic Part: Yes; Tolerance: ±1%; Temperature Coefficient: ±50ppm/℃; ComponentLink1Description: Datasheet; ComponentLink1URL: https://wmsc.lcsc.com/wmsc/upload/file/pdf/v2/lcsc/2201121730_FH--Guangdong-Fenghua-Advanced-Tech-MFJ12HR050FT_C2936658.pdf; ComponentLink2Description: JLCPCB Part URL; ComponentLink2URL: https://jlcpcb.com/partdetail/C2936658
pins: 1, 2
1 alternate drawing of the same symbol

## MFJ12KR020FT
designator R?  Resistance: 20mΩ  (hidden comment: *)
Resistor, 20mΩ, ±1%, 1W, ±100ppm/℃, SMD 2512; Manufacturer: Uniroyal; Manufacturer Part Number: MFJ12KR020FT; Supplier 1: LCSC; Supplier Part Number 1: C2991588; JLCPCB Part Number: C2991588; Power Rating: 1W; Category: Resistors; Package Size: 2512; JLCPCB Basic Part: Yes; Tolerance: ±1%; Temperature Coefficient: ±100ppm/℃; ComponentLink1Description: Datasheet; ComponentLink1URL: https://wmsc.lcsc.com/wmsc/upload/file/pdf/v2/lcsc/2204111630_FH--Guangdong-Fenghua-Advanced-Tech-MFJ12KR020FT_C2991588.pdf; ComponentLink2Description: JLCPCB Part URL; ComponentLink2URL: https://jlcpcb.com/partdetail/C2991588
pins: 1, 2
1 alternate drawing of the same symbol

## MFL12HR100FT
designator R?  Resistance: 100mΩ  (hidden comment: *)
Resistor, 100mΩ, ±1%, 2W, ±50ppm/℃, -55℃~+170℃, SMD 2512; Manufacturer: Uniroyal; Manufacturer Part Number: MFL12HR100FT; Supplier 1: LCSC; Supplier Part Number 1: C2961477; JLCPCB Part Number: C2961477; Power Rating: 2W; Category: Resistors; Package Size: 2512; JLCPCB Basic Part: Yes; Tolerance: ±1%; Temperature Coefficient: ±50ppm/℃; Temperature Rating: -55℃~+170℃; ComponentLink1Description: Datasheet; ComponentLink1URL: https://wmsc.lcsc.com/wmsc/upload/file/pdf/v2/lcsc/2202090930_FH--Guangdong-Fenghua-Advanced-Tech-MFL12HR100FT_C2961477.pdf; ComponentLink2Description: JLCPCB Part URL; ComponentLink2URL: https://jlcpcb.com/partdetail/C2961477
pins: 1, 2
1 alternate drawing of the same symbol

## MGL12KR008FT
designator R?  Resistance: 8mΩ  (hidden comment: *)
Resistor, 8mΩ, ±1%, 2W, ±100ppm/℃, -55℃~+170℃, SMD 2512; Manufacturer: Uniroyal; Manufacturer Part Number: MGL12KR008FT; Supplier 1: LCSC; Supplier Part Number 1: C1322429; JLCPCB Part Number: C1322429; Power Rating: 2W; Category: Resistors; Package Size: 2512; JLCPCB Basic Part: Yes; Tolerance: ±1%; Temperature Coefficient: ±100ppm/℃; Temperature Rating: -55℃~+170℃; ComponentLink1Description: Datasheet; ComponentLink1URL: https://wmsc.lcsc.com/wmsc/upload/file/pdf/v2/lcsc/2202221830_FH--Guangdong-Fenghua-Advanced-Tech-MGL12KR008FT_C1322429.pdf; ComponentLink2Description: JLCPCB Part URL; ComponentLink2URL: https://jlcpcb.com/partdetail/C1322429
pins: 1, 2
1 alternate drawing of the same symbol

## MGL12KR010FT
designator R?  Resistance: 10mΩ  (hidden comment: *)
Resistor, 10mΩ, ±1%, 2W, ±100ppm/℃, -55℃~+170℃, SMD 2512; Manufacturer: Uniroyal; Manufacturer Part Number: MGL12KR010FT; Supplier 1: LCSC; Supplier Part Number 1: C2961479; JLCPCB Part Number: C2961479; Power Rating: 2W; Category: Resistors; Package Size: 2512; JLCPCB Basic Part: Yes; Tolerance: ±1%; Temperature Coefficient: ±100ppm/℃; Temperature Rating: -55℃~+170℃; ComponentLink1Description: Datasheet; ComponentLink1URL: https://wmsc.lcsc.com/wmsc/upload/file/pdf/v2/lcsc/2202090930_FH--Guangdong-Fenghua-Advanced-Tech-MGL12KR010FT_C2961479.pdf; ComponentLink2Description: JLCPCB Part URL; ComponentLink2URL: https://jlcpcb.com/partdetail/C2961479
pins: 1, 2
1 alternate drawing of the same symbol

## NQ121WF1004T4E
designator R?  Resistance: 1MΩ  (hidden comment: *)
Resistor, 1MΩ, ±1%, 1W, ±100ppm/℃, SMD 2512; Manufacturer: Uniroyal; Manufacturer Part Number: NQ121WF1004T4E; Supplier 1: LCSC; Supplier Part Number 1: C964967; JLCPCB Part Number: C964967; Power Rating: 1W; Category: Resistors; Package Size: 2512; JLCPCB Basic Part: Yes; Tolerance: ±1%; Temperature Coefficient: ±100ppm/℃; ComponentLink1Description: Datasheet; ComponentLink1URL: https://wmsc.lcsc.com/wmsc/upload/file/pdf/v2/lcsc/2304140030_UNI-ROYAL-Uniroyal-Elec-NQ121WF1004T4E_C964967.pdf; ComponentLink2Description: JLCPCB Part URL; ComponentLink2URL: https://jlcpcb.com/partdetail/C964967
pins: 1, 2
1 alternate drawing of the same symbol

## NQ121WF3303T4E
designator R?  Resistance: 330kΩ  (hidden comment: *)
Resistor, 330kΩ, ±1%, 1W, ±100ppm/℃, SMD 2512; Manufacturer: Uniroyal; Manufacturer Part Number: NQ121WF3303T4E; Supplier 1: LCSC; Supplier Part Number 1: C964965; JLCPCB Part Number: C964965; Power Rating: 1W; Category: Resistors; Package Size: 2512; JLCPCB Basic Part: Yes; Tolerance: ±1%; Temperature Coefficient: ±100ppm/℃; ComponentLink1Description: Datasheet; ComponentLink1URL: https://wmsc.lcsc.com/wmsc/upload/file/pdf/v2/lcsc/2304140030_UNI-ROYAL-Uniroyal-Elec-NQ121WF3303T4E_C964965.pdf; ComponentLink2Description: JLCPCB Part URL; ComponentLink2URL: https://jlcpcb.com/partdetail/C964965
pins: 1, 2
1 alternate drawing of the same symbol

## NQ121WF4701T4E
designator R?  Resistance: 4.7kΩ  (hidden comment: *)
Resistor, 4.7kΩ, ±1%, 1W, ±100ppm/℃, SMD 2512; Manufacturer: Uniroyal; Manufacturer Part Number: NQ121WF4701T4E; Supplier 1: LCSC; Supplier Part Number 1: C964963; JLCPCB Part Number: C964963; Power Rating: 1W; Category: Resistors; Package Size: 2512; JLCPCB Basic Part: Yes; Tolerance: ±1%; Temperature Coefficient: ±100ppm/℃; ComponentLink1Description: Datasheet; ComponentLink1URL: https://wmsc.lcsc.com/wmsc/upload/file/pdf/v2/lcsc/2304140030_UNI-ROYAL-Uniroyal-Elec-NQ121WF4701T4E_C964963.pdf; ComponentLink2Description: JLCPCB Part URL; ComponentLink2URL: https://jlcpcb.com/partdetail/C964963
pins: 1, 2
1 alternate drawing of the same symbol

## NQ121WJ0101T4E
designator R?  Resistance: 100Ω  (hidden comment: *)
Resistor, 100Ω, ±5%, 1W, ±100ppm/℃, SMD 2512; Manufacturer: Uniroyal; Manufacturer Part Number: NQ121WJ0101T4E; Supplier 1: LCSC; Supplier Part Number 1: C964961; JLCPCB Part Number: C964961; Power Rating: 1W; Category: Resistors; Package Size: 2512; JLCPCB Basic Part: Yes; Tolerance: ±5%; Temperature Coefficient: ±100ppm/℃; ComponentLink1Description: Datasheet; ComponentLink1URL: https://wmsc.lcsc.com/wmsc/upload/file/pdf/v2/lcsc/2304140030_UNI-ROYAL-Uniroyal-Elec-NQ121WJ0101T4E_C964961.pdf; ComponentLink2Description: JLCPCB Part URL; ComponentLink2URL: https://jlcpcb.com/partdetail/C964961
pins: 1, 2
1 alternate drawing of the same symbol

## NQ121WJ0181T4E
designator R?  Resistance: 180Ω  (hidden comment: *)
Resistor, 180Ω, ±5%, 1W, 200V, ±100ppm/℃, -55℃~+155℃, SMD 2512; Manufacturer: Uniroyal; Manufacturer Part Number: NQ121WJ0181T4E; Supplier 1: LCSC; Supplier Part Number 1: C2758615; JLCPCB Part Number: C2758615; Power Rating: 1W; Category: Resistors; Package Size: 2512; JLCPCB Basic Part: Yes; Tolerance: ±5%; Voltage Rating: 200V; Temperature Coefficient: ±100ppm/℃; Temperature Rating: -55℃~+155℃; ComponentLink1Description: Datasheet; ComponentLink1URL: https://wmsc.lcsc.com/wmsc/upload/file/pdf/v2/lcsc/2304140030_UNI-ROYAL-Uniroyal-Elec-NQ121WJ0181T4E_C2758615.pdf; ComponentLink2Description: JLCPCB Part URL; ComponentLink2URL: https://jlcpcb.com/partdetail/C2758615
pins: 1, 2
1 alternate drawing of the same symbol

## NQ121WJ0182T4E
designator R?  Resistance: 1.8kΩ  (hidden comment: *)
Resistor, 1.8kΩ, ±5%, 1W, ±100ppm/℃, SMD 2512; Manufacturer: Uniroyal; Manufacturer Part Number: NQ121WJ0182T4E; Supplier 1: LCSC; Supplier Part Number 1: C964959; JLCPCB Part Number: C964959; Power Rating: 1W; Category: Resistors; Package Size: 2512; JLCPCB Basic Part: Yes; Tolerance: ±5%; Temperature Coefficient: ±100ppm/℃; ComponentLink1Description: Datasheet; ComponentLink1URL: https://wmsc.lcsc.com/wmsc/upload/file/pdf/v2/lcsc/2304140030_UNI-ROYAL-Uniroyal-Elec-NQ121WJ0182T4E_C964959.pdf; ComponentLink2Description: JLCPCB Part URL; ComponentLink2URL: https://jlcpcb.com/partdetail/C964959
pins: 1, 2
1 alternate drawing of the same symbol